# Altium footprint library DrPCB.PcbLib: 910 footprints (part 7 of 57)
Each footprint in its own frame and in the unit in brackets; x right, y up, seen from the top. Pads: shape width x height; smd on the part's side, far side on the other; paste and mask are expansions set on the pad; w line width, h text height; cw(c..) or ccw(c..) is an arc to the next point about the centre after c.
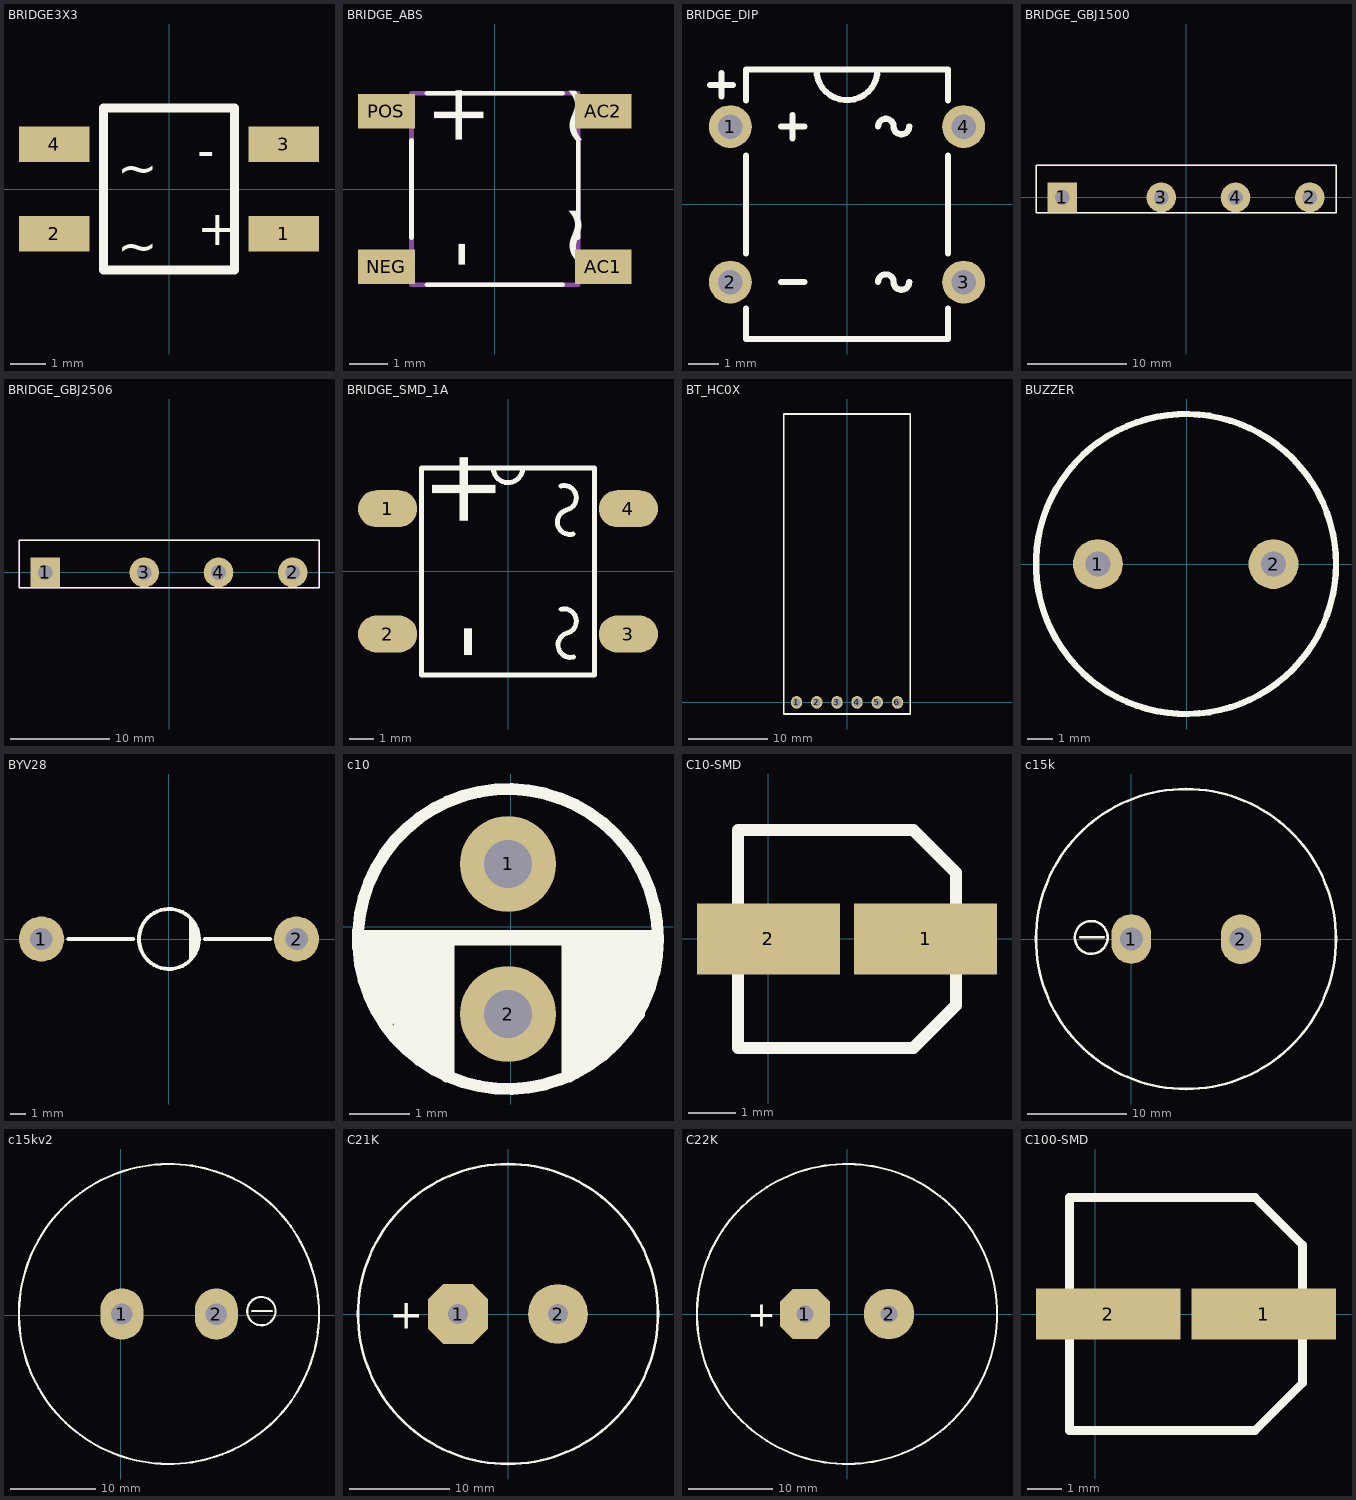
[diagram p6: the footprints below, top view; thin cyan lines are the x and y axes]

## BRIDGE3X3 [mm]
pads (4):
  rect 2x1 smd: 1(3.25,-1.27) 2(-3.25,-1.27) 3(3.25,1.27) 4(-3.25,1.27)
Top Overlay:
  lines w0.254: -1.85,-2.3 -1.85,2.3 1.85,2.3 1.85,-2.3 -1.85,-2.3
  text "~" at -1.46,-2.1 h1
  text "~" at -1.46,0.1 h1
  text "+" at 0.8,-1.6 h1
  text "-" at 0.8,0.6 h1
3D body "User Library-Bridge SMD TO-269AA.step": height 2.92, standoff 0.01, extent -3.52,-2.475 3.52,2.475

## BRIDGE_ABS [mm]
pads (4):
  rect 1.5x0.9 smd: AC1(2.86,-2.05) AC2(2.86,2.05) NEG(-2.86,-2.05) POS(-2.86,2.05)
Top Overlay:
  lines w0.127: -2.2,-1.28 -2.2,1.28 ; -1.79,-2.525 1.79,-2.525 ; -1.79,2.525 1.79,2.525 ; 2.2,-1.28 2.2,1.28
  text "~" at 2.781,1.067 h1.52
  text "~" at 2.781,-2.108 h1.52
  text "-" at -0.292,-2.108 h1.52
  text "+" at -0.292,1.079 h1.52
Mechanical 13:
  lines w0.127: -2.2,-2.525 -2.2,2.525 2.2,2.525 2.2,-2.525 -2.2,-2.525
3D body "User Library-ABS10.step": height 1.45, standoff 0, extent -3.2,-2.55 3.2,2.55

## BRIDGE_DIP [mm] "BRDIGE RECTIFIER, pitch: 5.08mm, 8X5mm"
pads (4):
  round 1.4 / inner round 1.4 / far side oct 2.2x1.4 hole 0.8: 1(-3.81,2.54)
  round 1.4 / inner round 1.4 / far side oval 2.2x1.4 hole 0.8: 2(-3.81,-2.54) 3(3.81,-2.54) 4(3.81,2.54)
Top Overlay:
  lines w0.2: -4.481,3.9 -3.719,3.9 ; -4.1,3.519 -4.1,4.281 ; -3.3,-3.4 -3.3,-4.4 3.3,-4.4 3.3,-3.4 ; -3.3,-1.6 -3.3,1.6 ; -3.3,3.4 -3.3,4.4 3.3,4.4 3.3,3.4 ; -2.159,-2.54 -1.397,-2.54 ; -2.159,2.54 -1.397,2.54 ; -1.778,2.159 -1.778,2.921 ; -1,4.4 ccw(c0,4.4) 1,4.4 ; 1.016,-2.54 cw(c1.27,-2.54) 1.524,-2.54 ccw(c1.778,-2.54) 2.032,-2.54 ; 1.016,2.54 cw(c1.27,2.54) 1.524,2.54 ccw(c1.778,2.54) 2.032,2.54 ; 3.3,-1.6 3.3,1.6
3D body "User Library-DFM_Bridge_Rectifier.step": height 4.05, standoff -3.35, extent -4,-4.255 4,4.255

## BRIDGE_GBJ1500 [mm]
pads (4):
  rect 3x3 hole 1.51: 1(-12.5,0)
  round 3 hole 1.51: 2(12.5,0) 3(-2.5,0) 4(5,0)
Top Overlay:
  lines w0.127: -15.15,-1.55 -15.15,3.25 15.15,3.25 15.15,-1.55 -15.15,-1.55
Mechanical 13:
  lines w0.127: -15.15,-1.55 -15.15,3.25 15.15,3.25 15.15,-1.55 -15.15,-1.55
3D body "step_temp.STEP": height 24.5, standoff -13.8, extent -15,-1.45 15,3.15

## BRIDGE_GBJ2506 [mm]
pads (4):
  rect 3x3 hole 1.51: 1(-12.5,0)
  round 3 hole 1.51: 2(12.5,0) 3(-2.5,0) 4(5,0)
Top Overlay:
  lines w0.127: -15.15,-1.55 15.15,-1.55 15.15,3.25 -15.15,3.25 -15.15,-1.55
Mechanical 13:
  lines w0.127: -15.15,-1.55 15.15,-1.55 15.15,3.25 -15.15,3.25 -15.15,-1.55
3D body "step_temp.STEP": height 24.5, standoff -13.8, extent -15,-1.45 15,3.15

## BRIDGE_SMD_1A [mm] "BRIDGE RECTIFIER, pitch: 5.08mm, 8X6mm, DB-S, DF005S"
pads (4):
  oval 2.4x1.5 smd: 1(-4.88,2.54) 2(-4.88,-2.54) 3(4.88,-2.54) 4(4.88,2.54)
Top Overlay:
  lines w0.2: -0.6,4.2 ccw(c0,4.2) 0.599,4.175 ; 2.141,-1.534 cw(c2.271,-2.017) 2.4,-2.5 ccw(c2.529,-2.983) 2.659,-3.466 ; 2.141,3.466 cw(c2.271,2.983) 2.4,2.5 ; 2.371,2.483 ccw(c2.5,2) 2.629,1.517 ; -3.5,-4.2 3.5,-4.2 3.5,4.2 -3.5,4.2 -3.5,-4.2
  text "+" at -0.5,1.6 h3
  text "-" at -0.5,-3.6 h3
3D body "User Library-PONTE-1_DF_smt.STEP": height 2.7, standoff 0, extent -5.075,-4.05 5.075,4.05

## BT_HC0X [mm] "Bluetooth HC-05"
pads (6):
  oval 1.4x1.6 / inner round 1.4 / far side oval 1.4x2.2 hole 1: 1(-6.35,0) 2(-3.81,0) 3(-1.27,0) 4(1.27,0) 5(3.81,0) 6(6.35,0)
Top Overlay:
  lines w0.2: -7.95,-1.461 7.95,-1.46 7.95,36.335 -7.95,36.335 -7.95,-1.46
3D body "HC-SERIES.stp": height 6.11, standoff -5.32, extent -7.85,-1.359 7.85,36.241

## BUZZER [mm]
pads (2):
  round 2 hole 1: 1(-3.543,0) 2(3.48,0)
Top Overlay:
  circle w0.254: c-0.02,0.003 r6
3D body "Buzzer.step": height 8.5, standoff -5.5, extent -6.02,-5.997 5.98,6.003

## BYV28 [mm]
pads (2):
  round 3 hole 1.5: 1(-8.5,0) 2(8.5,0)
Top Overlay:
  circle w0.254: c0,0 r2
  lines w0.254: -6.722,0 -2.404,0 ; 1.46,-1.333 1.46,1.333 ; 1.613,-1.067 1.613,1.041 ; 1.791,-0.749 1.791,0.737 ; 2.409,0 6.727,0

## c10 [mm]
pads (2):
  round 1.6 hole 0.8: 1(-0.05,1.044) 2(-0.05,-1.456)
Top Overlay:
  circle w0.2: c-0.05,-0.206 r2.5
  lines w0.254: -2.209,-1.202 -2.209,-0.186 ; -2.209,-0.948 -2.463,-0.694 -2.463,-0.186 2.363,-0.186 ; -2.082,-1.583 -2.082,-0.186 ; -1.828,-1.837 -1.828,-1.329 -1.828,-0.186 ; -1.701,-1.964 -1.701,-1.837 -1.701,-0.186 ; -1.574,-0.186 -1.574,-2.091 -1.447,-2.218 -1.447,-0.313 -1.32,-0.186 -1.32,-2.218 -1.193,-2.345 -1.193,-0.313 -1.066,-0.186 -1.066,-2.472 ; 0.966,-0.186 0.966,-2.472 1.093,-2.345 ; 1.093,-2.091 1.347,-2.091 ; 1.093,-2.345 1.093,-0.313 2.236,-0.313 2.363,-0.44 1.22,-0.44 1.093,-0.567 2.236,-0.567 2.236,-0.948 ; 1.093,-2.345 1.093,-1.837 ; 1.093,-2.345 1.347,-2.091 ; 1.093,-1.837 1.601,-1.837 ; 1.093,-1.837 1.347,-2.091 ; 1.347,-2.091 1.601,-1.837 ; 1.601,-1.837 1.855,-1.583 1.093,-1.583 0.966,-1.456 2.109,-1.456 2.109,-1.329 1.982,-1.202 1.093,-1.202 1.22,-1.075 2.109,-1.075 2.236,-0.948 ; 2.236,-0.948 2.109,-0.821 1.093,-0.821 1.093,-1.075 1.22,-0.948 2.236,-0.948

## C10-SMD [mm]
pads (2):
  rect 3x1.5 smd: 1(3.302,0) 2(0,0)
Top Overlay:
  lines w0.254: -0.635,-0.762 -0.635,-2.286 3.048,-2.286 3.937,-1.397 3.937,-0.762 ; -0.635,0.762 -0.635,2.286 3.048,2.286 3.937,1.397 3.937,0.762

## c15k [mm]
pads (2):
  oval 4x5 hole 2.3: 1(0,0) 2(11.025,-0.013)
Top Overlay:
  circle w0.254: c-4.04,0.156 r1.653
  circle w0.254: c5.5,0 r15.1
  lines w0.254: -5.153,0.183 -2.795,0.183

## c15kv2 [mm]
pads (2):
  oval 5x6 hole 2.5: 1(0.1,0.136) 2(11.125,0.123)
Top Overlay:
  circle w0.254: c5.6,0.136 r17.5
  circle w0.254: c16.383,0.469 r1.653
  lines w0.254: 15.27,0.496 17.628,0.496

## C21K [mm]
pads (2):
  oct 6x6 hole 2: 1(-5,0)
  round 6 hole 2: 2(5,0)
Top Overlay:
  circle w0.254: c0,0 r15
  text "+" at -11.887,-1.499 h3

## C22K [mm]
pads (2):
  oct 6x6 hole 2: 1(-5,0)
  round 6 hole 2: 2(5,0)
Top Overlay:
  circle w0.254: c0,0 r17.85
  text "+" at -11.887,-1.499 h3

## C100-SMD [mm]
pads (2):
  rect 4.255x1.5 smd: 1(4.953,0) 2(0.381,0)
Top Overlay:
  lines w0.254: -0.762,-0.762 -0.762,-3.429 4.699,-3.429 6.096,-2.032 6.096,-0.889 6.096,-0.762 ; -0.762,0.762 -0.762,3.429 4.699,3.429 6.096,2.032 6.096,0.762